# Altium footprint library Connector.PcbLib: 114 footprints (part 2 of 8)
Each footprint in its own frame and in the unit in brackets; x right, y up, seen from the top. Pads: shape width x height; smd on the part's side, far side on the other; paste and mask are expansions set on the pad; w line width, h text height; cw(c..) or ccw(c..) is an arc to the next point about the centre after c.
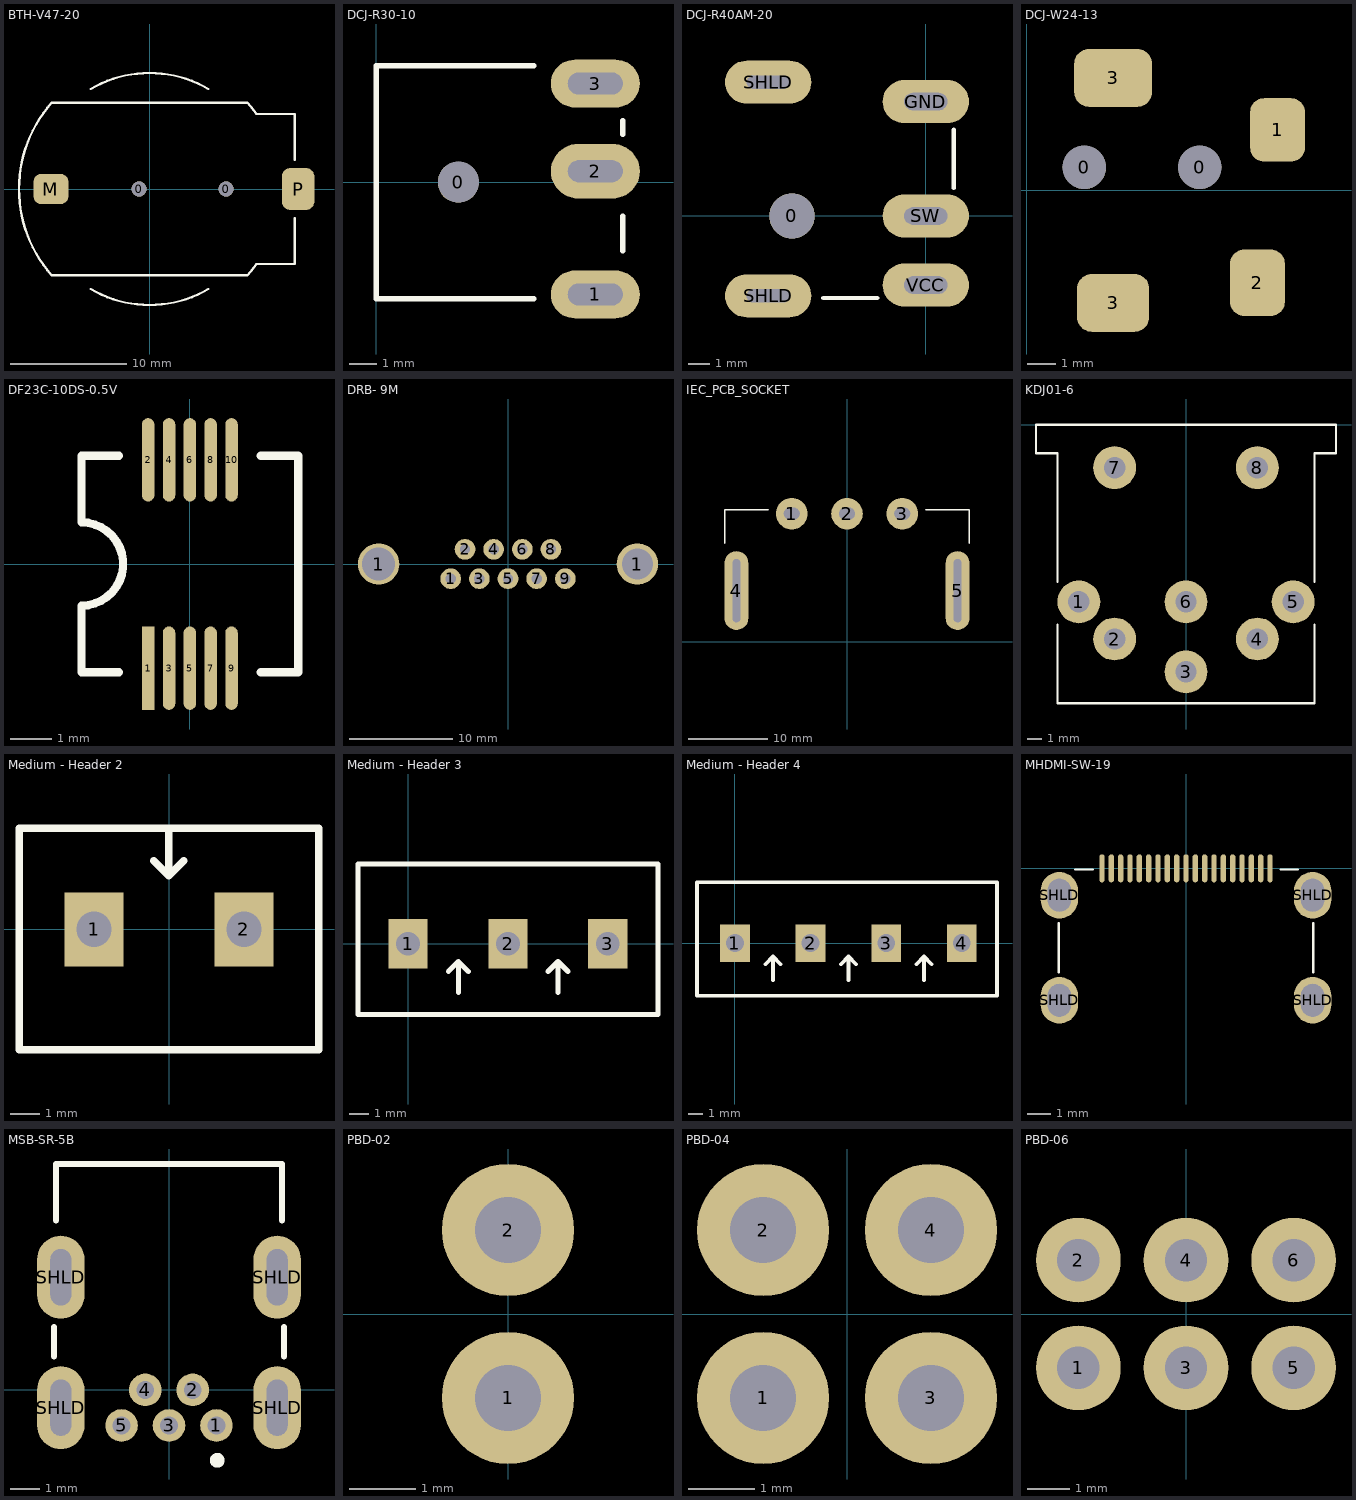
[diagram p1: the footprints below, top view; thin cyan lines are the x and y axes]

## BTH-V47-20 [mm] "Battery Holder"
height 4.7
pads (4):
  round 1.3 hole 1.3 unplated mask+0: 0(-0.9,0) 0(6.6,0)
  rrect50% 3x2.6 smd mask+0.1: M(-8.5,0)
  rrect50% 2.8x3.6 smd mask+0.1: P(12.8,0)
Top Overlay:
  lines w0.2: -5.07,-8.619 ccw(c0,0) 5.07,-8.619 ; -5.07,8.619 cw(c0,0) 5.07,8.619 ; 12.5,-2.5 12.5,-6.468 9.205,-6.468 cw(c0,0) 8.436,-7.443 -8.436,-7.443 cw(c0,0) -11.25,0 cw(c0,0) -8.436,7.443 8.436,7.443 cw(c0,0) 9.205,6.468 12.5,6.468 12.5,2.5
3D body "60488.stp": height 5.41, standoff 0.01, extent -11.15,-7.797 13.5,7.798

## DCJ-R30-10 [mm]
pads (4):
  round 1.5 hole 1.5 unplated: 0(3,0)
  oval 3.25x1.75 hole 0.8 slot 2 at 0 deg: 1(8,-4.1) 3(8,3.6)
  oval 3.25x2 hole 0.8 slot 2 at 0 deg: 2(8,0.4)
Top Overlay:
  lines w0.2: 5.75,-4.25 0,-4.25 0,4.25 5.75,4.25 ; 9,-2.5 9,-1.25 ; 9,1.75 9,2.25
3D body "DCJ-R30-10.STEP": height 5.52, standoff -2.98, extent 0,-4.3 9,4.3

## DCJ-R40AM-20 [mm]
height 7.2
pads (6):
  round 2.1 hole 2.1 unplated mask+0.05: 0(-6.2,0)
  oval 4x2 hole 0.8 slot 2 at 0 deg mask+0.05: GND(0,5.3) SW(0,0) VCC(0,-3.2)
  oval 4x2 hole 0.6 slot 2 at 0 deg mask+0.05: SHLD(-7.3,-3.7) SHLD(-7.3,6.2)
Top Overlay:
  lines w0.2: -4.75,-3.8 -2.25,-3.8 ; 1.3,1.3 1.3,4
3D body "DCJ-R40AM-xx.STEP": height 7.22, standoff -2.98, extent -10.3,-3.8 1.3,6.3

## DCJ-W24-13 [mm]
pads (6):
  round 1.5 hole 1.5 unplated: 0(2,0.8) 0(6,0.8)
  rrect50% 1.9x2.2 smd: 1(8.7,2.1)
  rrect50% 1.9x2.3 smd: 2(8,-3.2)
  rrect50% 2.5x2 smd: 3(3,-3.9)
  rrect50% 2.7x2 smd: 3(3,3.9)
3D body "DCJ-W24-10.STEP": height 5.02, standoff -0.98, extent -1.5,-4.571 9.5,4.571

## DF23C-10DS-0.5V [mm]
pads (10):
  rect 0.3x2 smd: 1(-1,-2.5)
  oval 0.3x2 smd: 2(-1,2.5) 3(-0.5,-2.5) 4(-0.5,2.5) 5(0,-2.5) 6(0,2.5) 7(0.5,-2.5) 8(0.5,2.5) 9(1,-2.5) 10(1,2.5)
Top Overlay:
  lines w0.2: -1.7,-2.6 -2.6,-2.6 -2.6,-1 ccw(c-2.6,0) -2.6,1 -2.6,2.6 -1.7,2.6 ; 1.7,-2.6 2.6,-2.6 2.6,2.6 1.7,2.6
Top Solder:
  region: -1.25,-1.5 -1.25,-3.5 -1.15,-3.6 1.15,-3.6 1.25,-3.5 1.25,-1.5 1.15,-1.4 -1.15,-1.4
  region: -1.25,3.5 -1.25,1.5 -1.15,1.4 1.15,1.4 1.25,1.5 1.25,3.5 1.15,3.6 -1.15,3.6
3D body "DF23C-10DS-0.5V.STEP": height 1.52, standoff 0.01, extent -2.6,-3.1 2.6,3.1

## DRB- 9M [mm]
pads (11):
  round 4 hole 3.2: 1(-12.5,0)
  round 2 hole 1: 1(-5.54,-1.42) 2(-4.155,1.42) 3(-2.77,-1.42) 4(-1.385,1.42) 5(0,-1.42) 6(1.385,1.42) 7(2.77,-1.42) 8(4.155,1.42) 9(5.54,-1.42)
  round 4 hole 3: 1(12.5,0)
3D body "User Library-DRB-9M.STEP": height 12.41, standoff -3.99, extent -15.25,-3.3 15.25,14.4

## IEC_PCB_SOCKET [mm]
pads (5):
  round 4 hole 1.5 slot 2 at 0 deg: 1(-7,16.25) 2(0,16.25) 3(7,16.25)
  oval 3x10 hole 1 slot 8 at 90 deg: 4(-14,6.5) 5(14,6.5)
Top Overlay:
  lines w0.2: -15.5,12.5 -15.5,16.75 -10,16.75 ; 10,16.75 15.5,16.75 15.5,12.5
3D body "IEC_PLUG_PCB.STEP": height 21.51, standoff -5.52, extent -15.5,-3.3 15.5,16.7

## KDJ01-6 [mm]
pads (8):
  round 3 hole 1.5: 1(-7.5,-12.4) 2(-5,-15) 3(0,-17.3) 4(5,-15) 5(7.5,-12.4) 6(0,-12.4) 7(-5,-3) 8(5,-3)
Top Overlay:
  lines w0.15: -9,-14 -9,-19.5 9,-19.5 9,-14 ; -9,-11 -9,-2 -10.5,-2 -10.5,0 10.5,0 10.5,-2 9,-2 9,-11
3D body "KDJ01-6.STEP": height 19.51, standoff -3.49, extent -10.5,-19.5 10.5,0

## Medium - Header 2 [mm]
pads (2):
  rect 2x2.5 hole 1.2: 1(-2.54,0) 2(2.54,0)
Top Overlay:
  lines w0.254: -0.521,2.324 -0.013,1.816 ; -0.013,3.378 -0.013,1.816 ; 0.495,2.324 -0.013,1.816 ; -5.08,-4.077 5.08,-4.077 5.08,3.429 -5.08,3.429 -5.08,-4.077
3D body "SW3DPS-HDR1x2-MED-GREEN.STEP": height 10, standoff -4, extent -5,-4.071 5,3.429

## Medium - Header 3 [mm]
pads (3):
  rect 2x2.5 hole 1.2: 1(0,0) 2(5.08,0) 3(10.147,0)
Top Overlay:
  lines w0.254: 2.045,-1.41 2.553,-0.902 ; 2.553,-2.464 2.553,-0.902 ; 3.061,-1.41 2.553,-0.902 ; 7.112,-1.41 7.62,-0.902 ; 7.62,-2.464 7.62,-0.902 ; 8.128,-1.41 7.62,-0.902 ; -2.54,-3.581 -2.54,4.064 12.7,4.064 12.7,-3.581 -2.54,-3.581
3D body "SW3DPS-HDR1x3-MED-GREEN.STEP": height 10, standoff -4, extent -2.42,-3.505 12.58,3.995

## Medium - Header 4 [mm]
pads (4):
  rect 2x2.5 hole 1.2: 1(0,0) 2(5.08,0) 3(10.147,0) 4(15.215,0)
Top Overlay:
  lines w0.254: 2.045,-1.41 2.553,-0.902 ; 2.553,-2.464 2.553,-0.902 ; 3.061,-1.41 2.553,-0.902 ; 7.112,-1.41 7.62,-0.902 ; 7.62,-2.464 7.62,-0.902 ; 8.128,-1.41 7.62,-0.902 ; 12.179,-1.41 12.687,-0.902 ; 12.687,-2.464 12.687,-0.902 ; 13.195,-1.41 12.687,-0.902 ; -2.54,-3.531 17.577,-3.531 17.577,4.089 -2.54,4.089 -2.54,-3.531
3D body "SW3DPS-HDR1x4-MED-GREEN.STEP": height 10, standoff -4, extent -2.431,-3.461 17.569,4.039

## MHDMI-SW-19 [mm]
pads (23):
  oval 0.23x1.2 smd mask+0.05: 1(3.6,0) 2(3.2,0) 3(2.8,0) 4(2.4,0) 5(2,0) 6(1.6,0) 7(1.2,0) 8(0.8,0) 9(0.4,0) 10(0,0) 11(-0.4,0) 12(-0.8,0) 13(-1.2,0) 14(-1.6,0) 15(-2,0) 16(-2.4,0) 17(-2.8,0) 18(-3.2,0) 19(-3.6,0)
  oval 1.6x2 hole 1 slot 1.4 at 90 deg unplated mask+0.05: SHLD(-5.425,-5.65) SHLD(-5.425,-1.15) SHLD(5.425,-5.65) SHLD(5.425,-1.15)
Top Overlay:
  lines w0.1: -5.45,-4.45 -5.45,-2.35 ; -4.75,-0.05 -4,-0.05 ; 4.05,-0.05 4.8,-0.05 ; 5.45,-4.45 5.45,-2.35
3D body "66169.stp": height 3.21, standoff -2.24, extent -5.6,-7.65 5.6,0.25

## MSB-SR-5B [mm] "Connector; USB Mini-B, Type 2, Thru-Hole; 5 Position; Vertical"
height 7.7
pads (9):
  round 1.1 hole 0.6 mask+0.1: 1(1.6,-1.2) 2(0.8,0) 3(0,-1.2) 4(-0.8,0) 5(-1.6,-1.2)
  oval 1.6x2.8 hole 0.7 slot 1.9 at 90 deg mask+0.1: SHLD(-3.65,-0.6) SHLD(-3.65,3.8) SHLD(3.65,-0.6) SHLD(3.65,3.8)
Top Overlay:
  circle w0.25: c1.625,-2.375 r0.125
  lines w0.2: -3.875,1.125 -3.875,2.125 ; -3.81,5.715 -3.81,7.62 3.81,7.62 3.81,5.715 ; 3.875,1.125 3.875,2.125
3D body "USB-Mini-B.STEP": height 3.97, standoff -1.78, extent -3.85,-1.4 3.85,7.6

## PBD-02 [mm]
pads (2):
  round 2 hole 1: 1(0,-1.27) 2(0,1.27)

## PBD-04 [mm]
pads (4):
  round 2 hole 1 unplated: 1(-1.27,-1.27) 2(-1.27,1.27) 4(1.27,1.27)
  round 2 hole 1: 3(1.27,-1.27)

## PBD-06 [mm]
pads (6):
  round 2 hole 1: 1(-2.54,-1.27)
  round 2 hole 1 unplated: 2(-2.54,1.27) 3(0,-1.27) 4(0,1.27) 5(2.54,-1.27) 6(2.54,1.27)